# Altium schematic symbol library jlcpcb_2025_04_capacitors_extended_1206.schlib: 2503 symbols (part 2 of 14) (continued)
## 1206B821K500NT
designator C?  Capacitance: 820pF  (hidden comment: *)
Capacitor, Ceramic (MLCC), 820pF, ±10%, 50V, X7R, ±10%, SMD 1206; Manufacturer: FH(Guangdong Fenghua Advanced Tech); Manufacturer Part Number: 1206B821K500NT; Package Size: 1206; JLCPCB Basic Part: No; JLCPCB Part Number: C153192; Supplier 1: LCSC; Category: Capacitors - MLCC; Supplier Part Number 1: C153192; Tolerance: ±10%; Voltage Rating: 50V; Temperature Coefficient: X7R; RoHS: Yes; ComponentLink1Description: Datasheet; ComponentLink1URL: https://wmsc.lcsc.com/wmsc/upload/file/pdf/v2/lcsc/2304140030_FH--Guangdong-Fenghua-Advanced-Tech-1206B821K500NT_C153192.pdf; ComponentLink2Description: JLCPCB Part URL; ComponentLink2URL: https://jlcpcb.com/partdetail/C153192; ComponentLink3Description: LCSC Part URL; ComponentLink3URL: https://lcsc.com/product-detail/Multilayer-Ceramic-Capacitors-MLCC---SMD-SMT_FH-Guangdong-Fenghua-Advanced-Tech-FH-Guangdong-Fenghua-Advanced-Tech-1206B821K500NT_C153192.html
footprint CAP-1206 (1206 (3216M) Capacitor)
pins: 1, 2

## 1206B822K500CT
designator C?  Capacitance: 8.2nF  (hidden comment: *)
Capacitor, Ceramic (MLCC), 8.2nF, ±10%, 50V, X7R, ±10%, SMD 1206; Manufacturer: Walsin Tech Corp; Manufacturer Part Number: 1206B822K500CT; Package Size: 1206; JLCPCB Basic Part: No; JLCPCB Part Number: C152825; Supplier 1: LCSC; Category: Capacitors - MLCC; Supplier Part Number 1: C152825; Tolerance: ±10%; Voltage Rating: 50V; Temperature Coefficient: X7R; RoHS: Yes; ComponentLink1Description: Datasheet; ComponentLink1URL: https://wmsc.lcsc.com/wmsc/upload/file/pdf/v2/lcsc/2304140030_Walsin-Tech-Corp-1206B822K500CT_C152825.pdf; ComponentLink2Description: JLCPCB Part URL; ComponentLink2URL: https://jlcpcb.com/partdetail/C152825; ComponentLink3Description: LCSC Part URL; ComponentLink3URL: https://lcsc.com/product-detail/Multilayer-Ceramic-Capacitors-MLCC---SMD-SMT_Walsin-Tech-Corp-Walsin-Tech-Corp-1206B822K500CT_C152825.html
footprint CAP-1206 (1206 (3216M) Capacitor)
pins: 1, 2

## 1206B822K500NT
designator C?  Capacitance: 8.2nF  (hidden comment: *)
Capacitor, Ceramic (MLCC), 8.2nF, ±10%, 50V, X7R, ±10%, SMD 1206; Manufacturer: FH (Guangdong Fenghua Advanced Tech); Manufacturer Part Number: 1206B822K500NT; Package Size: 1206; JLCPCB Basic Part: No; JLCPCB Part Number: C2840254; Supplier 1: LCSC; Category: Capacitors - MLCC; Supplier Part Number 1: C2840254; Tolerance: ±10%; Voltage Rating: 50V; Temperature Coefficient: X7R; RoHS: Yes; ComponentLink1Description: Datasheet; ComponentLink1URL: https://wmsc.lcsc.com/wmsc/upload/file/pdf/v2/lcsc/2202132000_FH--Guangdong-Fenghua-Advanced-Tech-1206B822K500NT_C2840254.pdf; ComponentLink2Description: JLCPCB Part URL; ComponentLink2URL: https://jlcpcb.com/partdetail/C2840254; ComponentLink3Description: LCSC Part URL; ComponentLink3URL: https://lcsc.com/product-detail/Multilayer-Ceramic-Capacitors-MLCC---SMD-SMT_FH-Guangdong-Fenghua-Advanced-Tech-FH-Guangdong-Fenghua-Advanced-Tech-1206B822K500NT_C2840254.html
footprint CAP-1206 (1206 (3216M) Capacitor)
pins: 1, 2

## 1206CG0R5C500NT
designator C?  Capacitance: 0.5pF  (hidden comment: *)
Capacitor, Ceramic (MLCC), 0.5pF, 50V, C0G, SMD 1206; Manufacturer: FH(Guangdong Fenghua Advanced Tech); Manufacturer Part Number: 1206CG0R5C500NT; Package Size: 1206; JLCPCB Basic Part: No; JLCPCB Part Number: C1882; Supplier 1: LCSC; Category: Capacitors - MLCC; Supplier Part Number 1: C1882; Voltage Rating: 50V; Temperature Coefficient: C0G; RoHS: Yes; ComponentLink1Description: Datasheet; ComponentLink1URL: https://wmsc.lcsc.com/wmsc/upload/file/pdf/v2/lcsc/2304140030_FH--Guangdong-Fenghua-Advanced-Tech-1206CG0R5C500NT_C1882.pdf; ComponentLink2Description: JLCPCB Part URL; ComponentLink2URL: https://jlcpcb.com/partdetail/C1882; ComponentLink3Description: LCSC Part URL; ComponentLink3URL: https://lcsc.com/product-detail/Multilayer-Ceramic-Capacitors-MLCC---SMD-SMT_FH-Guangdong-Fenghua-Advanced-Tech-FH-Guangdong-Fenghua-Advanced-Tech-1206CG0R5C500NT_C1882.html
footprint CAP-1206 (1206 (3216M) Capacitor)
pins: 1, 2

## 1206CG1R0C500NT
designator C?  Capacitance: 1pF  (hidden comment: *)
Capacitor, Ceramic (MLCC), 1pF, 50V, C0G, SMD 1206; Manufacturer: FH(Guangdong Fenghua Advanced Tech); Manufacturer Part Number: 1206CG1R0C500NT; Package Size: 1206; JLCPCB Basic Part: No; JLCPCB Part Number: C1891; Supplier 1: LCSC; Category: Capacitors - MLCC; Supplier Part Number 1: C1891; Voltage Rating: 50V; Temperature Coefficient: C0G; RoHS: Yes; ComponentLink1Description: Datasheet; ComponentLink1URL: https://wmsc.lcsc.com/wmsc/upload/file/pdf/v2/lcsc/2304140030_FH--Guangdong-Fenghua-Advanced-Tech-1206CG1R0C500NT_C1891.pdf; ComponentLink2Description: JLCPCB Part URL; ComponentLink2URL: https://jlcpcb.com/partdetail/C1891; ComponentLink3Description: LCSC Part URL; ComponentLink3URL: https://lcsc.com/product-detail/Multilayer-Ceramic-Capacitors-MLCC---SMD-SMT_FH-Guangdong-Fenghua-Advanced-Tech-FH-Guangdong-Fenghua-Advanced-Tech-1206CG1R0C500NT_C1891.html
footprint CAP-1206 (1206 (3216M) Capacitor)
pins: 1, 2

## 1206CG1R5C500NT
designator C?  Capacitance: 1.5pF  (hidden comment: *)
Capacitor, Ceramic (MLCC), 1.5pF, 50V, C0G, SMD 1206; Manufacturer: FH(Guangdong Fenghua Advanced Tech); Manufacturer Part Number: 1206CG1R5C500NT; Package Size: 1206; JLCPCB Basic Part: No; JLCPCB Part Number: C1892; Supplier 1: LCSC; Category: Capacitors - MLCC; Supplier Part Number 1: C1892; Voltage Rating: 50V; Temperature Coefficient: C0G; RoHS: Yes; ComponentLink1Description: Datasheet; ComponentLink1URL: https://wmsc.lcsc.com/wmsc/upload/file/pdf/v2/lcsc/2304140030_FH--Guangdong-Fenghua-Advanced-Tech-1206CG1R5C500NT_C1892.pdf; ComponentLink2Description: JLCPCB Part URL; ComponentLink2URL: https://jlcpcb.com/partdetail/C1892; ComponentLink3Description: LCSC Part URL; ComponentLink3URL: https://lcsc.com/product-detail/Multilayer-Ceramic-Capacitors-MLCC---SMD-SMT_FH-Guangdong-Fenghua-Advanced-Tech-FH-Guangdong-Fenghua-Advanced-Tech-1206CG1R5C500NT_C1892.html
footprint CAP-1206 (1206 (3216M) Capacitor)
pins: 1, 2

## 1206CG1R8C500NT
designator C?  Capacitance: 1.8pF  (hidden comment: *)
Capacitor, Ceramic (MLCC), 1.8pF, 50V, C0G, SMD 1206; Manufacturer: FH(Guangdong Fenghua Advanced Tech); Manufacturer Part Number: 1206CG1R8C500NT; Package Size: 1206; JLCPCB Basic Part: No; JLCPCB Part Number: C1893; Supplier 1: LCSC; Category: Capacitors - MLCC; Supplier Part Number 1: C1893; Voltage Rating: 50V; Temperature Coefficient: C0G; RoHS: Yes; ComponentLink1Description: Datasheet; ComponentLink1URL: https://wmsc.lcsc.com/wmsc/upload/file/pdf/v2/lcsc/2304140030_FH--Guangdong-Fenghua-Advanced-Tech-1206CG1R8C500NT_C1893.pdf; ComponentLink2Description: JLCPCB Part URL; ComponentLink2URL: https://jlcpcb.com/partdetail/C1893; ComponentLink3Description: LCSC Part URL; ComponentLink3URL: https://lcsc.com/product-detail/Multilayer-Ceramic-Capacitors-MLCC---SMD-SMT_FH-Guangdong-Fenghua-Advanced-Tech-FH-Guangdong-Fenghua-Advanced-Tech-1206CG1R8C500NT_C1893.html
footprint CAP-1206 (1206 (3216M) Capacitor)
pins: 1, 2

## 1206CG2R0C102NT
designator C?  Capacitance: 2pF  (hidden comment: *)
Capacitor, Ceramic (MLCC), 2pF, 1kV, SMD 1206; Manufacturer: FH (Guangdong Fenghua Advanced Tech); Manufacturer Part Number: 1206CG2R0C102NT; Package Size: 1206; JLCPCB Basic Part: No; JLCPCB Part Number: C5204925; Supplier 1: LCSC; Category: Capacitors - MLCC; Supplier Part Number 1: C5204925; Voltage Rating: 1kV; RoHS: Yes; ComponentLink1Description: Datasheet; ComponentLink1URL: https://wmsc.lcsc.com/wmsc/upload/file/pdf/v2/lcsc/2211081630_FH--Guangdong-Fenghua-Advanced-Tech-1206CG2R0C102NT_C5204925.pdf; ComponentLink2Description: JLCPCB Part URL; ComponentLink2URL: https://jlcpcb.com/partdetail/C5204925; ComponentLink3Description: LCSC Part URL; ComponentLink3URL: https://lcsc.com/product-detail/Multilayer-Ceramic-Capacitors-MLCC---SMD-SMT_FH-Guangdong-Fenghua-Advanced-Tech-FH-Guangdong-Fenghua-Advanced-Tech-1206CG2R0C102NT_C5204925.html
footprint CAP-1206 (1206 (3216M) Capacitor)
pins: 1, 2

## 1206CG2R0C500NT
designator C?  Capacitance: 2pF  (hidden comment: *)
Capacitor, Ceramic (MLCC), 2pF, 50V, C0G, SMD 1206; Manufacturer: FH(Guangdong Fenghua Advanced Tech); Manufacturer Part Number: 1206CG2R0C500NT; Package Size: 1206; JLCPCB Basic Part: No; JLCPCB Part Number: C1901; Supplier 1: LCSC; Category: Capacitors - MLCC; Supplier Part Number 1: C1901; Voltage Rating: 50V; Temperature Coefficient: C0G; RoHS: Yes; ComponentLink1Description: Datasheet; ComponentLink1URL: https://wmsc.lcsc.com/wmsc/upload/file/pdf/v2/lcsc/2304140030_FH--Guangdong-Fenghua-Advanced-Tech-1206CG2R0C500NT_C1901.pdf; ComponentLink2Description: JLCPCB Part URL; ComponentLink2URL: https://jlcpcb.com/partdetail/C1901; ComponentLink3Description: LCSC Part URL; ComponentLink3URL: https://lcsc.com/product-detail/Multilayer-Ceramic-Capacitors-MLCC---SMD-SMT_FH-Guangdong-Fenghua-Advanced-Tech-FH-Guangdong-Fenghua-Advanced-Tech-1206CG2R0C500NT_C1901.html
footprint CAP-1206 (1206 (3216M) Capacitor)
pins: 1, 2

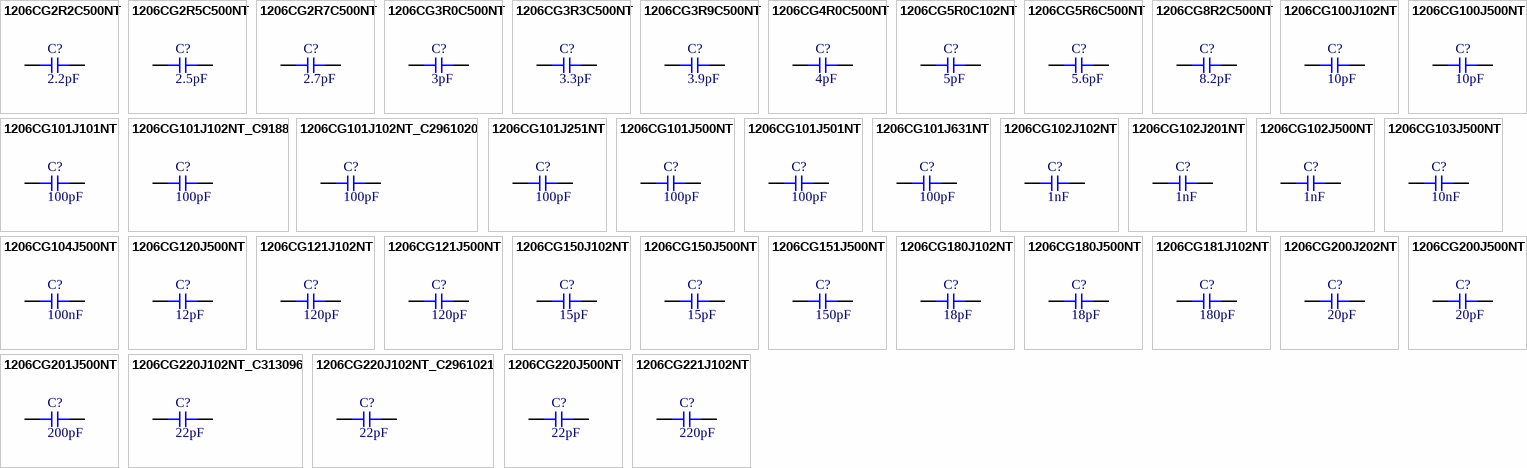
[diagram p8: symbols 1206CG2R2C500NT to 1206CG221J102NT]

## 1206CG2R2C500NT
designator C?  Capacitance: 2.2pF  (hidden comment: *)
Capacitor, Ceramic (MLCC), 2.2pF, 50V, C0G, SMD 1206; Manufacturer: FH(Guangdong Fenghua Advanced Tech); Manufacturer Part Number: 1206CG2R2C500NT; Package Size: 1206; JLCPCB Basic Part: No; JLCPCB Part Number: C1902; Supplier 1: LCSC; Category: Capacitors - MLCC; Supplier Part Number 1: C1902; Voltage Rating: 50V; Temperature Coefficient: C0G; RoHS: Yes; ComponentLink1Description: Datasheet; ComponentLink1URL: https://wmsc.lcsc.com/wmsc/upload/file/pdf/v2/lcsc/2304140030_FH--Guangdong-Fenghua-Advanced-Tech-1206CG2R2C500NT_C1902.pdf; ComponentLink2Description: JLCPCB Part URL; ComponentLink2URL: https://jlcpcb.com/partdetail/C1902; ComponentLink3Description: LCSC Part URL; ComponentLink3URL: https://lcsc.com/product-detail/Multilayer-Ceramic-Capacitors-MLCC---SMD-SMT_FH-Guangdong-Fenghua-Advanced-Tech-FH-Guangdong-Fenghua-Advanced-Tech-1206CG2R2C500NT_C1902.html
footprint CAP-1206 (1206 (3216M) Capacitor)
pins: 1, 2

## 1206CG2R5C500NT
designator C?  Capacitance: 2.5pF  (hidden comment: *)
Capacitor, Ceramic (MLCC), 2.5pF, 50V, C0G, SMD 1206; Manufacturer: FH(Guangdong Fenghua Advanced Tech); Manufacturer Part Number: 1206CG2R5C500NT; Package Size: 1206; JLCPCB Basic Part: No; JLCPCB Part Number: C1903; Supplier 1: LCSC; Category: Capacitors - MLCC; Supplier Part Number 1: C1903; Voltage Rating: 50V; Temperature Coefficient: C0G; RoHS: Yes; ComponentLink1Description: Datasheet; ComponentLink1URL: https://wmsc.lcsc.com/wmsc/upload/file/pdf/v2/lcsc/2304140030_FH--Guangdong-Fenghua-Advanced-Tech-1206CG2R5C500NT_C1903.pdf; ComponentLink2Description: JLCPCB Part URL; ComponentLink2URL: https://jlcpcb.com/partdetail/C1903; ComponentLink3Description: LCSC Part URL; ComponentLink3URL: https://lcsc.com/product-detail/Multilayer-Ceramic-Capacitors-MLCC---SMD-SMT_FH-Guangdong-Fenghua-Advanced-Tech-FH-Guangdong-Fenghua-Advanced-Tech-1206CG2R5C500NT_C1903.html
footprint CAP-1206 (1206 (3216M) Capacitor)
pins: 1, 2

## 1206CG2R7C500NT
designator C?  Capacitance: 2.7pF  (hidden comment: *)
Capacitor, Ceramic (MLCC), 2.7pF, 50V, C0G, SMD 1206; Manufacturer: FH(Guangdong Fenghua Advanced Tech); Manufacturer Part Number: 1206CG2R7C500NT; Package Size: 1206; JLCPCB Basic Part: No; JLCPCB Part Number: C1904; Supplier 1: LCSC; Category: Capacitors - MLCC; Supplier Part Number 1: C1904; Voltage Rating: 50V; Temperature Coefficient: C0G; RoHS: Yes; ComponentLink1Description: Datasheet; ComponentLink1URL: https://wmsc.lcsc.com/wmsc/upload/file/pdf/v2/lcsc/2304140030_FH--Guangdong-Fenghua-Advanced-Tech-1206CG2R7C500NT_C1904.pdf; ComponentLink2Description: JLCPCB Part URL; ComponentLink2URL: https://jlcpcb.com/partdetail/C1904; ComponentLink3Description: LCSC Part URL; ComponentLink3URL: https://lcsc.com/product-detail/Multilayer-Ceramic-Capacitors-MLCC---SMD-SMT_FH-Guangdong-Fenghua-Advanced-Tech-FH-Guangdong-Fenghua-Advanced-Tech-1206CG2R7C500NT_C1904.html
footprint CAP-1206 (1206 (3216M) Capacitor)
pins: 1, 2

## 1206CG3R0C500NT
designator C?  Capacitance: 3pF  (hidden comment: *)
Capacitor, Ceramic (MLCC), 3pF, 50V, C0G, SMD 1206; Manufacturer: FH(Guangdong Fenghua Advanced Tech); Manufacturer Part Number: 1206CG3R0C500NT; Package Size: 1206; JLCPCB Basic Part: No; JLCPCB Part Number: C1911; Supplier 1: LCSC; Category: Capacitors - MLCC; Supplier Part Number 1: C1911; Voltage Rating: 50V; Temperature Coefficient: C0G; RoHS: Yes; ComponentLink1Description: Datasheet; ComponentLink1URL: https://wmsc.lcsc.com/wmsc/upload/file/pdf/v2/lcsc/2304140030_FH--Guangdong-Fenghua-Advanced-Tech-1206CG3R0C500NT_C1911.pdf; ComponentLink2Description: JLCPCB Part URL; ComponentLink2URL: https://jlcpcb.com/partdetail/C1911; ComponentLink3Description: LCSC Part URL; ComponentLink3URL: https://lcsc.com/product-detail/Multilayer-Ceramic-Capacitors-MLCC---SMD-SMT_FH-Guangdong-Fenghua-Advanced-Tech-FH-Guangdong-Fenghua-Advanced-Tech-1206CG3R0C500NT_C1911.html
footprint CAP-1206 (1206 (3216M) Capacitor)
pins: 1, 2

## 1206CG3R3C500NT
designator C?  Capacitance: 3.3pF  (hidden comment: *)
Capacitor, Ceramic (MLCC), 3.3pF, 50V, C0G, SMD 1206; Manufacturer: FH(Guangdong Fenghua Advanced Tech); Manufacturer Part Number: 1206CG3R3C500NT; Package Size: 1206; JLCPCB Basic Part: No; JLCPCB Part Number: C1912; Supplier 1: LCSC; Category: Capacitors - MLCC; Supplier Part Number 1: C1912; Voltage Rating: 50V; Temperature Coefficient: C0G; RoHS: Yes; ComponentLink1Description: Datasheet; ComponentLink1URL: https://wmsc.lcsc.com/wmsc/upload/file/pdf/v2/lcsc/2304140030_FH--Guangdong-Fenghua-Advanced-Tech-1206CG3R3C500NT_C1912.pdf; ComponentLink2Description: JLCPCB Part URL; ComponentLink2URL: https://jlcpcb.com/partdetail/C1912; ComponentLink3Description: LCSC Part URL; ComponentLink3URL: https://lcsc.com/product-detail/Multilayer-Ceramic-Capacitors-MLCC---SMD-SMT_FH-Guangdong-Fenghua-Advanced-Tech-FH-Guangdong-Fenghua-Advanced-Tech-1206CG3R3C500NT_C1912.html
footprint CAP-1206 (1206 (3216M) Capacitor)
pins: 1, 2

## 1206CG3R9C500NT
designator C?  Capacitance: 3.9pF  (hidden comment: *)
Capacitor, Ceramic (MLCC), 3.9pF, 50V, C0G, SMD 1206; Manufacturer: FH(Guangdong Fenghua Advanced Tech); Manufacturer Part Number: 1206CG3R9C500NT; Package Size: 1206; JLCPCB Basic Part: No; JLCPCB Part Number: C1913; Supplier 1: LCSC; Category: Capacitors - MLCC; Supplier Part Number 1: C1913; Voltage Rating: 50V; Temperature Coefficient: C0G; RoHS: Yes; ComponentLink1Description: Datasheet; ComponentLink1URL: https://wmsc.lcsc.com/wmsc/upload/file/pdf/v2/lcsc/2304140030_FH--Guangdong-Fenghua-Advanced-Tech-1206CG3R9C500NT_C1913.pdf; ComponentLink2Description: JLCPCB Part URL; ComponentLink2URL: https://jlcpcb.com/partdetail/C1913; ComponentLink3Description: LCSC Part URL; ComponentLink3URL: https://lcsc.com/product-detail/Multilayer-Ceramic-Capacitors-MLCC---SMD-SMT_FH-Guangdong-Fenghua-Advanced-Tech-FH-Guangdong-Fenghua-Advanced-Tech-1206CG3R9C500NT_C1913.html
footprint CAP-1206 (1206 (3216M) Capacitor)
pins: 1, 2

## 1206CG4R0C500NT
designator C?  Capacitance: 4pF  (hidden comment: *)
Capacitor, Ceramic (MLCC), 4pF, 50V, C0G, SMD 1206; Manufacturer: FH(Guangdong Fenghua Advanced Tech); Manufacturer Part Number: 1206CG4R0C500NT; Package Size: 1206; JLCPCB Basic Part: No; JLCPCB Part Number: C1914; Supplier 1: LCSC; Category: Capacitors - MLCC; Supplier Part Number 1: C1914; Voltage Rating: 50V; Temperature Coefficient: C0G; RoHS: Yes; ComponentLink1Description: Datasheet; ComponentLink1URL: https://wmsc.lcsc.com/wmsc/upload/file/pdf/v2/lcsc/2304140030_FH--Guangdong-Fenghua-Advanced-Tech-1206CG4R0C500NT_C1914.pdf; ComponentLink2Description: JLCPCB Part URL; ComponentLink2URL: https://jlcpcb.com/partdetail/C1914; ComponentLink3Description: LCSC Part URL; ComponentLink3URL: https://lcsc.com/product-detail/Multilayer-Ceramic-Capacitors-MLCC---SMD-SMT_FH-Guangdong-Fenghua-Advanced-Tech-FH-Guangdong-Fenghua-Advanced-Tech-1206CG4R0C500NT_C1914.html
footprint CAP-1206 (1206 (3216M) Capacitor)
pins: 1, 2

## 1206CG5R0C102NT
designator C?  Capacitance: 5pF  (hidden comment: *)
Capacitor, Ceramic (MLCC), 5pF, 1kV, C0G, SMD 1206; Manufacturer: FH(Guangdong Fenghua Advanced Tech); Manufacturer Part Number: 1206CG5R0C102NT; Package Size: 1206; JLCPCB Basic Part: No; JLCPCB Part Number: C78277; Supplier 1: LCSC; Category: Capacitors - MLCC; Supplier Part Number 1: C78277; Voltage Rating: 1kV; Temperature Coefficient: C0G; RoHS: Yes; ComponentLink1Description: Datasheet; ComponentLink1URL: https://wmsc.lcsc.com/wmsc/upload/file/pdf/v2/lcsc/2304140030_FH--Guangdong-Fenghua-Advanced-Tech-1206CG5R0C102NT_C78277.pdf; ComponentLink2Description: JLCPCB Part URL; ComponentLink2URL: https://jlcpcb.com/partdetail/C78277; ComponentLink3Description: LCSC Part URL; ComponentLink3URL: https://lcsc.com/product-detail/Multilayer-Ceramic-Capacitors-MLCC---SMD-SMT_FH-Guangdong-Fenghua-Advanced-Tech-FH-Guangdong-Fenghua-Advanced-Tech-1206CG5R0C102NT--_C78277.html
footprint CAP-1206 (1206 (3216M) Capacitor)
pins: 1, 2

## 1206CG5R6C500NT
designator C?  Capacitance: 5.6pF  (hidden comment: *)
Capacitor, Ceramic (MLCC), 5.6pF, 50V, SMD 1206; Manufacturer: FH(Guangdong Fenghua Advanced Tech); Manufacturer Part Number: 1206CG5R6C500NT; Package Size: 1206; JLCPCB Basic Part: No; JLCPCB Part Number: C1322389; Supplier 1: LCSC; Category: Capacitors - MLCC; Supplier Part Number 1: C1322389; Voltage Rating: 50V; RoHS: Yes; ComponentLink1Description: Datasheet; ComponentLink1URL: https://wmsc.lcsc.com/wmsc/upload/file/pdf/v2/lcsc/2304140030_FH--Guangdong-Fenghua-Advanced-Tech-1206CG5R6C500NT_C1322389.pdf; ComponentLink2Description: JLCPCB Part URL; ComponentLink2URL: https://jlcpcb.com/partdetail/C1322389; ComponentLink3Description: LCSC Part URL; ComponentLink3URL: https://lcsc.com/product-detail/Multilayer-Ceramic-Capacitors-MLCC---SMD-SMT_FH-Guangdong-Fenghua-Advanced-Tech-FH-Guangdong-Fenghua-Advanced-Tech-1206CG5R6C500NT_C1322389.html
footprint CAP-1206 (1206 (3216M) Capacitor)
pins: 1, 2

## 1206CG8R2C500NT
designator C?  Capacitance: 8.2pF  (hidden comment: *)
Capacitor, Ceramic (MLCC), 8.2pF, 500V, C0G, SMD 1206; Manufacturer: FH (Guangdong Fenghua Advanced Tech); Manufacturer Part Number: 1206CG8R2C500NT; Package Size: 1206; JLCPCB Basic Part: No; JLCPCB Part Number: C3037650; Supplier 1: LCSC; Category: Capacitors - MLCC; Supplier Part Number 1: C3037650; Voltage Rating: 500V; Temperature Coefficient: C0G; RoHS: Yes; ComponentLink1Description: Datasheet; ComponentLink1URL: https://wmsc.lcsc.com/wmsc/upload/file/pdf/v2/lcsc/2206171645_FH--Guangdong-Fenghua-Advanced-Tech-1206CG8R2C500NT_C3037650.pdf; ComponentLink2Description: JLCPCB Part URL; ComponentLink2URL: https://jlcpcb.com/partdetail/C3037650; ComponentLink3Description: LCSC Part URL; ComponentLink3URL: https://lcsc.com/product-detail/Multilayer-Ceramic-Capacitors-MLCC---SMD-SMT_FH-Guangdong-Fenghua-Advanced-Tech-FH-Guangdong-Fenghua-Advanced-Tech-1206CG8R2C500NT_C3037650.html
footprint CAP-1206 (1206 (3216M) Capacitor)
pins: 1, 2

## 1206CG100J102NT
designator C?  Capacitance: 10pF  (hidden comment: *)
Capacitor, Ceramic (MLCC), 10pF, ±5%, 1kV, C0G, ±5%, SMD 1206; Manufacturer: FH(Guangdong Fenghua Advanced Tech); Manufacturer Part Number: 1206CG100J102NT; Package Size: 1206; JLCPCB Basic Part: No; JLCPCB Part Number: C47534; Supplier 1: LCSC; Category: Capacitors - MLCC; Supplier Part Number 1: C47534; Tolerance: ±5%; Voltage Rating: 1kV; Temperature Coefficient: C0G; RoHS: Yes; ComponentLink1Description: Datasheet; ComponentLink1URL: https://wmsc.lcsc.com/wmsc/upload/file/pdf/v2/lcsc/2304140030_FH--Guangdong-Fenghua-Advanced-Tech-1206CG100J102NT_C47534.pdf; ComponentLink2Description: JLCPCB Part URL; ComponentLink2URL: https://jlcpcb.com/partdetail/C47534; ComponentLink3Description: LCSC Part URL; ComponentLink3URL: https://lcsc.com/product-detail/Multilayer-Ceramic-Capacitors-MLCC---SMD-SMT_FH-Guangdong-Fenghua-Advanced-Tech-FH-Guangdong-Fenghua-Advanced-Tech-1206CG100J102NT_C47534.html
footprint CAP-1206 (1206 (3216M) Capacitor)
pins: 1, 2

## 1206CG100J500NT
designator C?  Capacitance: 10pF  (hidden comment: *)
Capacitor, Ceramic (MLCC), 10pF, ±5%, 50V, C0G, ±5%, SMD 1206; Manufacturer: FH(Guangdong Fenghua Advanced Tech); Manufacturer Part Number: 1206CG100J500NT; Package Size: 1206; JLCPCB Basic Part: No; JLCPCB Part Number: C1883; Supplier 1: LCSC; Category: Capacitors - MLCC; Supplier Part Number 1: C1883; Tolerance: ±5%; Voltage Rating: 50V; Temperature Coefficient: C0G; RoHS: Yes; ComponentLink1Description: Datasheet; ComponentLink1URL: https://wmsc.lcsc.com/wmsc/upload/file/pdf/v2/lcsc/2304140030_FH--Guangdong-Fenghua-Advanced-Tech-1206CG100J500NT_C1883.pdf; ComponentLink2Description: JLCPCB Part URL; ComponentLink2URL: https://jlcpcb.com/partdetail/C1883; ComponentLink3Description: LCSC Part URL; ComponentLink3URL: https://lcsc.com/product-detail/Multilayer-Ceramic-Capacitors-MLCC---SMD-SMT_FH-Guangdong-Fenghua-Advanced-Tech-FH-Guangdong-Fenghua-Advanced-Tech-1206CG100J500NT_C1883.html
footprint CAP-1206 (1206 (3216M) Capacitor)
pins: 1, 2

## 1206CG101J101NT
designator C?  Capacitance: 100pF  (hidden comment: *)
Capacitor, Ceramic (MLCC), 100pF, ±5%, 100V, C0G, ±5%, SMD 1206; Manufacturer: FH(Guangdong Fenghua Advanced Tech); Manufacturer Part Number: 1206CG101J101NT; Package Size: 1206; JLCPCB Basic Part: No; JLCPCB Part Number: C44911; Supplier 1: LCSC; Category: Capacitors - MLCC; Supplier Part Number 1: C44911; Tolerance: ±5%; Voltage Rating: 100V; Temperature Coefficient: C0G; RoHS: Yes; ComponentLink1Description: Datasheet; ComponentLink1URL: https://wmsc.lcsc.com/wmsc/upload/file/pdf/v2/lcsc/2304140030_FH--Guangdong-Fenghua-Advanced-Tech-1206CG101J101NT_C44911.pdf; ComponentLink2Description: JLCPCB Part URL; ComponentLink2URL: https://jlcpcb.com/partdetail/C44911; ComponentLink3Description: LCSC Part URL; ComponentLink3URL: https://lcsc.com/product-detail/Multilayer-Ceramic-Capacitors-MLCC---SMD-SMT_FH-Guangdong-Fenghua-Advanced-Tech-FH-Guangdong-Fenghua-Advanced-Tech-1206CG101J101NT_C44911.html
footprint CAP-1206 (1206 (3216M) Capacitor)
pins: 1, 2

## 1206CG101J102NT_C9188
designator C?  Capacitance: 100pF  (hidden comment: *)
Capacitor, Ceramic (MLCC), 100pF, ±5%, 1kV, C0G, ±5%, SMD 1206; Manufacturer: FH(Guangdong Fenghua Advanced Tech); Manufacturer Part Number: 1206CG101J102NT; Package Size: 1206; JLCPCB Basic Part: No; JLCPCB Part Number: C9188; Supplier 1: LCSC; Category: Capacitors - MLCC; Supplier Part Number 1: C9188; Tolerance: ±5%; Voltage Rating: 1kV; Temperature Coefficient: C0G; RoHS: Yes; ComponentLink1Description: Datasheet; ComponentLink1URL: https://wmsc.lcsc.com/wmsc/upload/file/pdf/v2/lcsc/2304140030_FH--Guangdong-Fenghua-Advanced-Tech-1206CG101J102NT_C9188.pdf; ComponentLink2Description: JLCPCB Part URL; ComponentLink2URL: https://jlcpcb.com/partdetail/C9188; ComponentLink3Description: LCSC Part URL; ComponentLink3URL: https://lcsc.com/product-detail/Multilayer-Ceramic-Capacitors-MLCC---SMD-SMT_FH-Guangdong-Fenghua-Advanced-Tech-FH-Guangdong-Fenghua-Advanced-Tech-1206CG101J102NT_C9188.html
footprint CAP-1206 (1206 (3216M) Capacitor)
pins: 1, 2

## 1206CG101J102NT_C2961020
designator C?  Capacitance: 100pF  (hidden comment: *)
Capacitor, Ceramic (MLCC), 100pF, 1kV, C0G, SMD 1206; Manufacturer: FH-BK(Guangdong Fenghua Bangke Elec); Manufacturer Part Number: 1206CG101J102NT; Package Size: 1206; JLCPCB Basic Part: No; JLCPCB Part Number: C2961020; Supplier 1: LCSC; Category: Capacitors - MLCC; Supplier Part Number 1: C2961020; Voltage Rating: 1kV; Temperature Coefficient: C0G; RoHS: Yes; ComponentLink1Description: Datasheet; ComponentLink1URL: https://wmsc.lcsc.com/wmsc/upload/file/pdf/v2/lcsc/2201191030_FH-BK-Guangdong-Fenghua-Bangke-Elec-1206CG101J102NT_C2961020.pdf; ComponentLink2Description: JLCPCB Part URL; ComponentLink2URL: https://jlcpcb.com/partdetail/C2961020; ComponentLink3Description: LCSC Part URL; ComponentLink3URL: https://lcsc.com/product-detail/Multilayer-Ceramic-Capacitors-MLCC---SMD-SMT_FH-BKGuangdong-Fenghua-Bangke-Elec-FH-BKGuangdong-Fenghua-Bangke-Elec-1206CG101J102NT_C2961020.html
footprint CAP-1206 (1206 (3216M) Capacitor)
pins: 1, 2

## 1206CG101J251NT
designator C?  Capacitance: 100pF  (hidden comment: *)
Capacitor, Ceramic (MLCC), 100pF, ±5%, 250V, C0G, ±5%, SMD 1206; Manufacturer: FH(Guangdong Fenghua Advanced Tech); Manufacturer Part Number: 1206CG101J251NT; Package Size: 1206; JLCPCB Basic Part: No; JLCPCB Part Number: C27260; Supplier 1: LCSC; Category: Capacitors - MLCC; Supplier Part Number 1: C27260; Tolerance: ±5%; Voltage Rating: 250V; Temperature Coefficient: C0G; RoHS: Yes; ComponentLink1Description: Datasheet; ComponentLink1URL: https://wmsc.lcsc.com/wmsc/upload/file/pdf/v2/lcsc/2304140030_FH--Guangdong-Fenghua-Advanced-Tech-1206CG101J251NT_C27260.pdf; ComponentLink2Description: JLCPCB Part URL; ComponentLink2URL: https://jlcpcb.com/partdetail/C27260; ComponentLink3Description: LCSC Part URL; ComponentLink3URL: https://lcsc.com/product-detail/Multilayer-Ceramic-Capacitors-MLCC---SMD-SMT_FH-Guangdong-Fenghua-Advanced-Tech-FH-Guangdong-Fenghua-Advanced-Tech-1206CG101J251NT_C27260.html
footprint CAP-1206 (1206 (3216M) Capacitor)
pins: 1, 2

## 1206CG101J500NT
designator C?  Capacitance: 100pF  (hidden comment: *)
Capacitor, Ceramic (MLCC), 100pF, ±5%, 50V, C0G, ±5%, SMD 1206; Manufacturer: FH(Guangdong Fenghua Advanced Tech); Manufacturer Part Number: 1206CG101J500NT; Package Size: 1206; JLCPCB Basic Part: No; JLCPCB Part Number: C1884; Supplier 1: LCSC; Category: Capacitors - MLCC; Supplier Part Number 1: C1884; Tolerance: ±5%; Voltage Rating: 50V; Temperature Coefficient: C0G; RoHS: Yes; ComponentLink1Description: Datasheet; ComponentLink1URL: https://wmsc.lcsc.com/wmsc/upload/file/pdf/v2/lcsc/2304140030_FH--Guangdong-Fenghua-Advanced-Tech-1206CG101J500NT_C1884.pdf; ComponentLink2Description: JLCPCB Part URL; ComponentLink2URL: https://jlcpcb.com/partdetail/C1884; ComponentLink3Description: LCSC Part URL; ComponentLink3URL: https://lcsc.com/product-detail/Multilayer-Ceramic-Capacitors-MLCC---SMD-SMT_FH-Guangdong-Fenghua-Advanced-Tech-FH-Guangdong-Fenghua-Advanced-Tech-1206CG101J500NT_C1884.html
footprint CAP-1206 (1206 (3216M) Capacitor)
pins: 1, 2

## 1206CG101J501NT
designator C?  Capacitance: 100pF  (hidden comment: *)
Capacitor, Ceramic (MLCC), 100pF, 500V, C0G, SMD 1206; Manufacturer: FH(Guangdong Fenghua Advanced Tech); Manufacturer Part Number: 1206CG101J501NT; Package Size: 1206; JLCPCB Basic Part: No; JLCPCB Part Number: C2936649; Supplier 1: LCSC; Category: Capacitors - MLCC; Supplier Part Number 1: C2936649; Voltage Rating: 500V; Temperature Coefficient: C0G; RoHS: Yes; ComponentLink1Description: Datasheet; ComponentLink1URL: https://wmsc.lcsc.com/wmsc/upload/file/pdf/v2/lcsc/2201121730_FH--Guangdong-Fenghua-Advanced-Tech-1206CG101J501NT_C2936649.pdf; ComponentLink2Description: JLCPCB Part URL; ComponentLink2URL: https://jlcpcb.com/partdetail/C2936649; ComponentLink3Description: LCSC Part URL; ComponentLink3URL: https://lcsc.com/product-detail/Multilayer-Ceramic-Capacitors-MLCC---SMD-SMT_FH-Guangdong-Fenghua-Advanced-Tech-FH-Guangdong-Fenghua-Advanced-Tech-1206CG101J501NT_C2936649.html
footprint CAP-1206 (1206 (3216M) Capacitor)
pins: 1, 2

## 1206CG101J631NT
designator C?  Capacitance: 100pF  (hidden comment: *)
Capacitor, Ceramic (MLCC), 100pF, ±5%, 630V, C0G, ±5%, SMD 1206; Manufacturer: FH (Guangdong Fenghua Advanced Tech); Manufacturer Part Number: 1206CG101J631NT; Package Size: 1206; JLCPCB Basic Part: No; JLCPCB Part Number: C2991652; Supplier 1: LCSC; Category: Capacitors - MLCC; Supplier Part Number 1: C2991652; Tolerance: ±5%; Voltage Rating: 630V; Temperature Coefficient: C0G; RoHS: Yes; ComponentLink1Description: Datasheet; ComponentLink1URL: https://wmsc.lcsc.com/wmsc/upload/file/pdf/v2/lcsc/2204111630_FH--Guangdong-Fenghua-Advanced-Tech-1206CG101J631NT_C2991652.pdf; ComponentLink2Description: JLCPCB Part URL; ComponentLink2URL: https://jlcpcb.com/partdetail/C2991652; ComponentLink3Description: LCSC Part URL; ComponentLink3URL: https://lcsc.com/product-detail/Multilayer-Ceramic-Capacitors-MLCC---SMD-SMT_FH-Guangdong-Fenghua-Advanced-Tech-FH-Guangdong-Fenghua-Advanced-Tech-1206CG101J631NT_C2991652.html
footprint CAP-1206 (1206 (3216M) Capacitor)
pins: 1, 2

## 1206CG102J102NT
designator C?  Capacitance: 1nF  (hidden comment: *)
Capacitor, Ceramic (MLCC), 1nF, ±5%, 1kV, C0G, ±5%, SMD 1206; Manufacturer: FH(Guangdong Fenghua Advanced Tech); Manufacturer Part Number: 1206CG102J102NT; Package Size: 1206; JLCPCB Basic Part: No; JLCPCB Part Number: C99465; Supplier 1: LCSC; Category: Capacitors - MLCC; Supplier Part Number 1: C99465; Tolerance: ±5%; Voltage Rating: 1kV; Temperature Coefficient: C0G; RoHS: Yes; ComponentLink1Description: Datasheet; ComponentLink1URL: https://wmsc.lcsc.com/wmsc/upload/file/pdf/v2/lcsc/2304140030_FH--Guangdong-Fenghua-Advanced-Tech-1206CG102J102NT_C99465.pdf; ComponentLink2Description: JLCPCB Part URL; ComponentLink2URL: https://jlcpcb.com/partdetail/C99465; ComponentLink3Description: LCSC Part URL; ComponentLink3URL: https://lcsc.com/product-detail/Multilayer-Ceramic-Capacitors-MLCC---SMD-SMT_FH-Guangdong-Fenghua-Advanced-Tech-FH-Guangdong-Fenghua-Advanced-Tech-1206CG102J102NT_C99465.html
footprint CAP-1206 (1206 (3216M) Capacitor)
pins: 1, 2

## 1206CG102J201NT
designator C?  Capacitance: 1nF  (hidden comment: *)
Capacitor, Ceramic (MLCC), 1nF, ±5%, 200V, C0G, ±5%, SMD 1206; Manufacturer: FH (Guangdong Fenghua Advanced Tech); Manufacturer Part Number: 1206CG102J201NT; Package Size: 1206; JLCPCB Basic Part: No; JLCPCB Part Number: C2991640; Supplier 1: LCSC; Category: Capacitors - MLCC; Supplier Part Number 1: C2991640; Tolerance: ±5%; Voltage Rating: 200V; Temperature Coefficient: C0G; RoHS: Yes; ComponentLink1Description: Datasheet; ComponentLink1URL: https://wmsc.lcsc.com/wmsc/upload/file/pdf/v2/lcsc/2204111630_FH--Guangdong-Fenghua-Advanced-Tech-1206CG102J201NT_C2991640.pdf; ComponentLink2Description: JLCPCB Part URL; ComponentLink2URL: https://jlcpcb.com/partdetail/C2991640; ComponentLink3Description: LCSC Part URL; ComponentLink3URL: https://lcsc.com/product-detail/Multilayer-Ceramic-Capacitors-MLCC---SMD-SMT_FH-Guangdong-Fenghua-Advanced-Tech-FH-Guangdong-Fenghua-Advanced-Tech-1206CG102J201NT_C2991640.html
footprint CAP-1206 (1206 (3216M) Capacitor)
pins: 1, 2

## 1206CG102J500NT
designator C?  Capacitance: 1nF  (hidden comment: *)
Capacitor, Ceramic (MLCC), 1nF, ±5%, 50V, C0G, ±5%, SMD 1206; Manufacturer: FH(Guangdong Fenghua Advanced Tech); Manufacturer Part Number: 1206CG102J500NT; Package Size: 1206; JLCPCB Basic Part: No; JLCPCB Part Number: C1885; Supplier 1: LCSC; Category: Capacitors - MLCC; Supplier Part Number 1: C1885; Tolerance: ±5%; Voltage Rating: 50V; Temperature Coefficient: C0G; RoHS: Yes; ComponentLink1Description: Datasheet; ComponentLink1URL: https://wmsc.lcsc.com/wmsc/upload/file/pdf/v2/lcsc/2304140030_FH--Guangdong-Fenghua-Advanced-Tech-1206CG102J500NT_C1885.pdf; ComponentLink2Description: JLCPCB Part URL; ComponentLink2URL: https://jlcpcb.com/partdetail/C1885; ComponentLink3Description: LCSC Part URL; ComponentLink3URL: https://lcsc.com/product-detail/Multilayer-Ceramic-Capacitors-MLCC---SMD-SMT_FH-Guangdong-Fenghua-Advanced-Tech-FH-Guangdong-Fenghua-Advanced-Tech-1206CG102J500NT_C1885.html
footprint CAP-1206 (1206 (3216M) Capacitor)
pins: 1, 2

## 1206CG103J500NT
designator C?  Capacitance: 10nF  (hidden comment: *)
Capacitor, Ceramic (MLCC), 10nF, ±5%, 50V, C0G, ±5%, SMD 1206; Manufacturer: FH(Guangdong Fenghua Advanced Tech); Manufacturer Part Number: 1206CG103J500NT; Package Size: 1206; JLCPCB Basic Part: No; JLCPCB Part Number: C250548; Supplier 1: LCSC; Category: Capacitors - MLCC; Supplier Part Number 1: C250548; Tolerance: ±5%; Voltage Rating: 50V; Temperature Coefficient: C0G; RoHS: Yes; ComponentLink1Description: Datasheet; ComponentLink2Description: JLCPCB Part URL; ComponentLink2URL: https://jlcpcb.com/partdetail/C250548; ComponentLink3Description: LCSC Part URL; ComponentLink3URL: https://lcsc.com/product-detail/Multilayer-Ceramic-Capacitors-MLCC---SMD-SMT_FH-Guangdong-Fenghua-Advanced-Tech-FH-Guangdong-Fenghua-Advanced-Tech-1206CG103J500NT_C250548.html
footprint CAP-1206 (1206 (3216M) Capacitor)
pins: 1, 2

## 1206CG104J500NT
designator C?  Capacitance: 100nF  (hidden comment: *)
Capacitor, Ceramic (MLCC), 100nF, ±5%, 50V, C0G, ±5%, SMD 1206; Manufacturer: FH(Guangdong Fenghua Advanced Tech); Manufacturer Part Number: 1206CG104J500NT; Package Size: 1206; JLCPCB Basic Part: No; JLCPCB Part Number: C46348; Supplier 1: LCSC; Category: Capacitors - MLCC; Supplier Part Number 1: C46348; Tolerance: ±5%; Voltage Rating: 50V; Temperature Coefficient: C0G; RoHS: Yes; ComponentLink1Description: Datasheet; ComponentLink1URL: https://wmsc.lcsc.com/wmsc/upload/file/pdf/v2/lcsc/2304140030_FH--Guangdong-Fenghua-Advanced-Tech-1206CG104J500NT_C46348.pdf; ComponentLink2Description: JLCPCB Part URL; ComponentLink2URL: https://jlcpcb.com/partdetail/C46348; ComponentLink3Description: LCSC Part URL; ComponentLink3URL: https://lcsc.com/product-detail/Multilayer-Ceramic-Capacitors-MLCC---SMD-SMT_FH-Guangdong-Fenghua-Advanced-Tech-FH-Guangdong-Fenghua-Advanced-Tech-1206CG104J500NT_C46348.html
footprint CAP-1206 (1206 (3216M) Capacitor)
pins: 1, 2

## 1206CG120J500NT
designator C?  Capacitance: 12pF  (hidden comment: *)
Capacitor, Ceramic (MLCC), 12pF, ±5%, 50V, C0G, ±5%, SMD 1206; Manufacturer: FH(Guangdong Fenghua Advanced Tech); Manufacturer Part Number: 1206CG120J500NT; Package Size: 1206; JLCPCB Basic Part: No; JLCPCB Part Number: C1886; Supplier 1: LCSC; Category: Capacitors - MLCC; Supplier Part Number 1: C1886; Tolerance: ±5%; Voltage Rating: 50V; Temperature Coefficient: C0G; RoHS: Yes; ComponentLink1Description: Datasheet; ComponentLink1URL: https://wmsc.lcsc.com/wmsc/upload/file/pdf/v2/lcsc/2304140030_FH--Guangdong-Fenghua-Advanced-Tech-1206CG120J500NT_C1886.pdf; ComponentLink2Description: JLCPCB Part URL; ComponentLink2URL: https://jlcpcb.com/partdetail/C1886; ComponentLink3Description: LCSC Part URL; ComponentLink3URL: https://lcsc.com/product-detail/Multilayer-Ceramic-Capacitors-MLCC---SMD-SMT_FH-Guangdong-Fenghua-Advanced-Tech-FH-Guangdong-Fenghua-Advanced-Tech-1206CG120J500NT_C1886.html
footprint CAP-1206 (1206 (3216M) Capacitor)
pins: 1, 2

## 1206CG121J102NT
designator C?  Capacitance: 120pF  (hidden comment: *)
Capacitor, Ceramic (MLCC), 120pF, 1kV, C0G, SMD 1206; Manufacturer: FH (Guangdong Fenghua Advanced Tech); Manufacturer Part Number: 1206CG121J102NT; Package Size: 1206; JLCPCB Basic Part: No; JLCPCB Part Number: C3037665; Supplier 1: LCSC; Category: Capacitors - MLCC; Supplier Part Number 1: C3037665; Voltage Rating: 1kV; Temperature Coefficient: C0G; RoHS: Yes; ComponentLink1Description: Datasheet; ComponentLink1URL: https://wmsc.lcsc.com/wmsc/upload/file/pdf/v2/lcsc/2206171645_FH--Guangdong-Fenghua-Advanced-Tech-1206CG121J102NT_C3037665.pdf; ComponentLink2Description: JLCPCB Part URL; ComponentLink2URL: https://jlcpcb.com/partdetail/C3037665; ComponentLink3Description: LCSC Part URL; ComponentLink3URL: https://lcsc.com/product-detail/Multilayer-Ceramic-Capacitors-MLCC---SMD-SMT_FH-Guangdong-Fenghua-Advanced-Tech-FH-Guangdong-Fenghua-Advanced-Tech-1206CG121J102NT_C3037665.html
footprint CAP-1206 (1206 (3216M) Capacitor)
pins: 1, 2

## 1206CG121J500NT
designator C?  Capacitance: 120pF  (hidden comment: *)
Capacitor, Ceramic (MLCC), 120pF, ±5%, 50V, C0G, ±5%, SMD 1206; Manufacturer: FH(Guangdong Fenghua Advanced Tech); Manufacturer Part Number: 1206CG121J500NT; Package Size: 1206; JLCPCB Basic Part: No; JLCPCB Part Number: C66626; Supplier 1: LCSC; Category: Capacitors - MLCC; Supplier Part Number 1: C66626; Tolerance: ±5%; Voltage Rating: 50V; Temperature Coefficient: C0G; RoHS: Yes; ComponentLink1Description: Datasheet; ComponentLink1URL: https://wmsc.lcsc.com/wmsc/upload/file/pdf/v2/lcsc/2304140030_FH--Guangdong-Fenghua-Advanced-Tech-1206CG121J500NT_C66626.pdf; ComponentLink2Description: JLCPCB Part URL; ComponentLink2URL: https://jlcpcb.com/partdetail/C66626; ComponentLink3Description: LCSC Part URL; ComponentLink3URL: https://lcsc.com/product-detail/Multilayer-Ceramic-Capacitors-MLCC---SMD-SMT_FH-Guangdong-Fenghua-Advanced-Tech-FH-Guangdong-Fenghua-Advanced-Tech-1206CG121J500NT_C66626.html
footprint CAP-1206 (1206 (3216M) Capacitor)
pins: 1, 2

## 1206CG150J102NT
designator C?  Capacitance: 15pF  (hidden comment: *)
Capacitor, Ceramic (MLCC), 15pF, 1kV, SMD 1206; Manufacturer: FH (Guangdong Fenghua Advanced Tech); Manufacturer Part Number: 1206CG150J102NT; Package Size: 1206; JLCPCB Basic Part: No; JLCPCB Part Number: C2859278; Supplier 1: LCSC; Category: Capacitors - MLCC; Supplier Part Number 1: C2859278; Voltage Rating: 1kV; RoHS: Yes; ComponentLink1Description: Datasheet; ComponentLink2Description: JLCPCB Part URL; ComponentLink2URL: https://jlcpcb.com/partdetail/C2859278; ComponentLink3Description: LCSC Part URL; ComponentLink3URL: https://lcsc.com/product-detail/Multilayer-Ceramic-Capacitors-MLCC---SMD-SMT_FH-Guangdong-Fenghua-Advanced-Tech-FH-Guangdong-Fenghua-Advanced-Tech-1206CG150J102NT_C2859278.html
footprint CAP-1206 (1206 (3216M) Capacitor)
pins: 1, 2

## 1206CG150J500NT
designator C?  Capacitance: 15pF  (hidden comment: *)
Capacitor, Ceramic (MLCC), 15pF, ±5%, 50V, C0G, ±5%, SMD 1206; Manufacturer: FH(Guangdong Fenghua Advanced Tech); Manufacturer Part Number: 1206CG150J500NT; Package Size: 1206; JLCPCB Basic Part: No; JLCPCB Part Number: C1887; Supplier 1: LCSC; Category: Capacitors - MLCC; Supplier Part Number 1: C1887; Tolerance: ±5%; Voltage Rating: 50V; Temperature Coefficient: C0G; RoHS: Yes; ComponentLink1Description: Datasheet; ComponentLink1URL: https://wmsc.lcsc.com/wmsc/upload/file/pdf/v2/lcsc/2304140030_FH--Guangdong-Fenghua-Advanced-Tech-1206CG150J500NT_C1887.pdf; ComponentLink2Description: JLCPCB Part URL; ComponentLink2URL: https://jlcpcb.com/partdetail/C1887; ComponentLink3Description: LCSC Part URL; ComponentLink3URL: https://lcsc.com/product-detail/Multilayer-Ceramic-Capacitors-MLCC---SMD-SMT_FH-Guangdong-Fenghua-Advanced-Tech-FH-Guangdong-Fenghua-Advanced-Tech-1206CG150J500NT_C1887.html
footprint CAP-1206 (1206 (3216M) Capacitor)
pins: 1, 2

## 1206CG151J500NT
designator C?  Capacitance: 150pF  (hidden comment: *)
Capacitor, Ceramic (MLCC), 150pF, ±5%, 50V, C0G, ±5%, SMD 1206; Manufacturer: FH(Guangdong Fenghua Advanced Tech); Manufacturer Part Number: 1206CG151J500NT; Package Size: 1206; JLCPCB Basic Part: No; JLCPCB Part Number: C1888; Supplier 1: LCSC; Category: Capacitors - MLCC; Supplier Part Number 1: C1888; Tolerance: ±5%; Voltage Rating: 50V; Temperature Coefficient: C0G; RoHS: Yes; ComponentLink1Description: Datasheet; ComponentLink1URL: https://wmsc.lcsc.com/wmsc/upload/file/pdf/v2/lcsc/2304140030_FH--Guangdong-Fenghua-Advanced-Tech-1206CG151J500NT_C1888.pdf; ComponentLink2Description: JLCPCB Part URL; ComponentLink2URL: https://jlcpcb.com/partdetail/C1888; ComponentLink3Description: LCSC Part URL; ComponentLink3URL: https://lcsc.com/product-detail/Multilayer-Ceramic-Capacitors-MLCC---SMD-SMT_FH-Guangdong-Fenghua-Advanced-Tech-FH-Guangdong-Fenghua-Advanced-Tech-1206CG151J500NT_C1888.html
footprint CAP-1206 (1206 (3216M) Capacitor)
pins: 1, 2

## 1206CG180J102NT
designator C?  Capacitance: 18pF  (hidden comment: *)
Capacitor, Ceramic (MLCC), 18pF, ±5%, 1kV, C0G, ±5%, SMD 1206; Manufacturer: FH(Guangdong Fenghua Advanced Tech); Manufacturer Part Number: 1206CG180J102NT; Package Size: 1206; JLCPCB Basic Part: No; JLCPCB Part Number: C33039; Supplier 1: LCSC; Category: Capacitors - MLCC; Supplier Part Number 1: C33039; Tolerance: ±5%; Voltage Rating: 1kV; Temperature Coefficient: C0G; RoHS: Yes; ComponentLink1Description: Datasheet; ComponentLink1URL: https://wmsc.lcsc.com/wmsc/upload/file/pdf/v2/lcsc/2304140030_FH--Guangdong-Fenghua-Advanced-Tech-1206CG180J102NT_C33039.pdf; ComponentLink2Description: JLCPCB Part URL; ComponentLink2URL: https://jlcpcb.com/partdetail/C33039; ComponentLink3Description: LCSC Part URL; ComponentLink3URL: https://lcsc.com/product-detail/Multilayer-Ceramic-Capacitors-MLCC---SMD-SMT_FH-Guangdong-Fenghua-Advanced-Tech-FH-Guangdong-Fenghua-Advanced-Tech-1206CG180J102NT_C33039.html
footprint CAP-1206 (1206 (3216M) Capacitor)
pins: 1, 2

## 1206CG180J500NT
designator C?  Capacitance: 18pF  (hidden comment: *)
Capacitor, Ceramic (MLCC), 18pF, ±5%, 50V, C0G, ±5%, SMD 1206; Manufacturer: FH(Guangdong Fenghua Advanced Tech); Manufacturer Part Number: 1206CG180J500NT; Package Size: 1206; JLCPCB Basic Part: No; JLCPCB Part Number: C1889; Supplier 1: LCSC; Category: Capacitors - MLCC; Supplier Part Number 1: C1889; Tolerance: ±5%; Voltage Rating: 50V; Temperature Coefficient: C0G; RoHS: Yes; ComponentLink1Description: Datasheet; ComponentLink1URL: https://wmsc.lcsc.com/wmsc/upload/file/pdf/v2/lcsc/2304140030_FH--Guangdong-Fenghua-Advanced-Tech-1206CG180J500NT_C1889.pdf; ComponentLink2Description: JLCPCB Part URL; ComponentLink2URL: https://jlcpcb.com/partdetail/C1889; ComponentLink3Description: LCSC Part URL; ComponentLink3URL: https://lcsc.com/product-detail/Multilayer-Ceramic-Capacitors-MLCC---SMD-SMT_FH-Guangdong-Fenghua-Advanced-Tech-FH-Guangdong-Fenghua-Advanced-Tech-1206CG180J500NT_C1889.html
footprint CAP-1206 (1206 (3216M) Capacitor)
pins: 1, 2

## 1206CG181J102NT
designator C?  Capacitance: 180pF  (hidden comment: *)
Capacitor, Ceramic (MLCC), 180pF, ±5%, 1kV, ±5%, SMD 1206; Manufacturer: FH (Guangdong Fenghua Advanced Tech); Manufacturer Part Number: 1206CG181J102NT; Package Size: 1206; JLCPCB Basic Part: No; JLCPCB Part Number: C2894316; Supplier 1: LCSC; Category: Capacitors - MLCC; Supplier Part Number 1: C2894316; Tolerance: ±5%; Voltage Rating: 1kV; RoHS: Yes; ComponentLink1Description: Datasheet; ComponentLink1URL: https://wmsc.lcsc.com/wmsc/upload/file/pdf/v2/lcsc/2109100930_FH--Guangdong-Fenghua-Advanced-Tech-1206CG181J102NT_C2894316.pdf; ComponentLink2Description: JLCPCB Part URL; ComponentLink2URL: https://jlcpcb.com/partdetail/C2894316; ComponentLink3Description: LCSC Part URL; ComponentLink3URL: https://lcsc.com/product-detail/Multilayer-Ceramic-Capacitors-MLCC---SMD-SMT_FH-Guangdong-Fenghua-Advanced-Tech-FH-Guangdong-Fenghua-Advanced-Tech-1206CG181J102NT_C2894316.html
footprint CAP-1206 (1206 (3216M) Capacitor)
pins: 1, 2

## 1206CG200J202NT
designator C?  Capacitance: 20pF  (hidden comment: *)
Capacitor, Ceramic (MLCC), 20pF, 2kV, C0G, SMD 1206; Manufacturer: FH(Guangdong Fenghua Advanced Tech); Manufacturer Part Number: 1206CG200J202NT; Package Size: 1206; JLCPCB Basic Part: No; JLCPCB Part Number: C2762328; Supplier 1: LCSC; Category: Capacitors - MLCC; Supplier Part Number 1: C2762328; Voltage Rating: 2kV; Temperature Coefficient: C0G; RoHS: Yes; ComponentLink1Description: Datasheet; ComponentLink1URL: https://wmsc.lcsc.com/wmsc/upload/file/pdf/v2/lcsc/2201121200_FH--Guangdong-Fenghua-Advanced-Tech-1206CG200J202NT_C2762328.pdf; ComponentLink2Description: JLCPCB Part URL; ComponentLink2URL: https://jlcpcb.com/partdetail/C2762328; ComponentLink3Description: LCSC Part URL; ComponentLink3URL: https://lcsc.com/product-detail/Multilayer-Ceramic-Capacitors-MLCC---SMD-SMT_FH-Guangdong-Fenghua-Advanced-Tech-FH-Guangdong-Fenghua-Advanced-Tech-1206CG200J202NT_C2762328.html
footprint CAP-1206 (1206 (3216M) Capacitor)
pins: 1, 2

## 1206CG200J500NT
designator C?  Capacitance: 20pF  (hidden comment: *)
Capacitor, Ceramic (MLCC), 20pF, ±5%, 50V, C0G, ±5%, SMD 1206; Manufacturer: FH(Guangdong Fenghua Advanced Tech); Manufacturer Part Number: 1206CG200J500NT; Package Size: 1206; JLCPCB Basic Part: No; JLCPCB Part Number: C1894; Supplier 1: LCSC; Category: Capacitors - MLCC; Supplier Part Number 1: C1894; Tolerance: ±5%; Voltage Rating: 50V; Temperature Coefficient: C0G; RoHS: Yes; ComponentLink1Description: Datasheet; ComponentLink1URL: https://wmsc.lcsc.com/wmsc/upload/file/pdf/v2/lcsc/2304140030_FH--Guangdong-Fenghua-Advanced-Tech-1206CG200J500NT_C1894.pdf; ComponentLink2Description: JLCPCB Part URL; ComponentLink2URL: https://jlcpcb.com/partdetail/C1894; ComponentLink3Description: LCSC Part URL; ComponentLink3URL: https://lcsc.com/product-detail/Multilayer-Ceramic-Capacitors-MLCC---SMD-SMT_FH-Guangdong-Fenghua-Advanced-Tech-FH-Guangdong-Fenghua-Advanced-Tech-1206CG200J500NT_C1894.html
footprint CAP-1206 (1206 (3216M) Capacitor)
pins: 1, 2

## 1206CG201J500NT
designator C?  Capacitance: 200pF  (hidden comment: *)
Capacitor, Ceramic (MLCC), 200pF, ±5%, 50V, C0G, ±5%, SMD 1206; Manufacturer: FH(Guangdong Fenghua Advanced Tech); Manufacturer Part Number: 1206CG201J500NT; Package Size: 1206; JLCPCB Basic Part: No; JLCPCB Part Number: C1895; Supplier 1: LCSC; Category: Capacitors - MLCC; Supplier Part Number 1: C1895; Tolerance: ±5%; Voltage Rating: 50V; Temperature Coefficient: C0G; RoHS: Yes; ComponentLink1Description: Datasheet; ComponentLink1URL: https://wmsc.lcsc.com/wmsc/upload/file/pdf/v2/lcsc/2304140030_FH--Guangdong-Fenghua-Advanced-Tech-1206CG201J500NT_C1895.pdf; ComponentLink2Description: JLCPCB Part URL; ComponentLink2URL: https://jlcpcb.com/partdetail/C1895; ComponentLink3Description: LCSC Part URL; ComponentLink3URL: https://lcsc.com/product-detail/Multilayer-Ceramic-Capacitors-MLCC---SMD-SMT_FH-Guangdong-Fenghua-Advanced-Tech-FH-Guangdong-Fenghua-Advanced-Tech-1206CG201J500NT_C1895.html
footprint CAP-1206 (1206 (3216M) Capacitor)
pins: 1, 2

## 1206CG220J102NT_C313096
designator C?  Capacitance: 22pF  (hidden comment: *)
Capacitor, Ceramic (MLCC), 22pF, ±5%, 1kV, C0G, ±5%, SMD 1206; Manufacturer: FH(Guangdong Fenghua Advanced Tech); Manufacturer Part Number: 1206CG220J102NT; Package Size: 1206; JLCPCB Basic Part: No; JLCPCB Part Number: C313096; Supplier 1: LCSC; Category: Capacitors - MLCC; Supplier Part Number 1: C313096; Tolerance: ±5%; Voltage Rating: 1kV; Temperature Coefficient: C0G; RoHS: Yes; ComponentLink1Description: Datasheet; ComponentLink1URL: https://wmsc.lcsc.com/wmsc/upload/file/pdf/v2/lcsc/2304140030_FH--Guangdong-Fenghua-Advanced-Tech-1206CG220J102NT_C313096.pdf; ComponentLink2Description: JLCPCB Part URL; ComponentLink2URL: https://jlcpcb.com/partdetail/C313096; ComponentLink3Description: LCSC Part URL; ComponentLink3URL: https://lcsc.com/product-detail/Multilayer-Ceramic-Capacitors-MLCC---SMD-SMT_FH-Guangdong-Fenghua-Advanced-Tech-FH-Guangdong-Fenghua-Advanced-Tech-1206CG220J102NT_C313096.html
footprint CAP-1206 (1206 (3216M) Capacitor)
pins: 1, 2

## 1206CG220J102NT_C2961021
designator C?  Capacitance: 22pF  (hidden comment: *)
Capacitor, Ceramic (MLCC), 22pF, 1kV, C0G, SMD 1206; Manufacturer: FH-BK(Guangdong Fenghua Bangke Elec); Manufacturer Part Number: 1206CG220J102NT; Package Size: 1206; JLCPCB Basic Part: No; JLCPCB Part Number: C2961021; Supplier 1: LCSC; Category: Capacitors - MLCC; Supplier Part Number 1: C2961021; Voltage Rating: 1kV; Temperature Coefficient: C0G; RoHS: Yes; ComponentLink1Description: Datasheet; ComponentLink1URL: https://wmsc.lcsc.com/wmsc/upload/file/pdf/v2/lcsc/2201191030_FH-BK-Guangdong-Fenghua-Bangke-Elec-1206CG220J102NT_C2961021.pdf; ComponentLink2Description: JLCPCB Part URL; ComponentLink2URL: https://jlcpcb.com/partdetail/C2961021; ComponentLink3Description: LCSC Part URL; ComponentLink3URL: https://lcsc.com/product-detail/Multilayer-Ceramic-Capacitors-MLCC---SMD-SMT_FH-BKGuangdong-Fenghua-Bangke-Elec-FH-BKGuangdong-Fenghua-Bangke-Elec-1206CG220J102NT_C2961021.html
footprint CAP-1206 (1206 (3216M) Capacitor)
pins: 1, 2